# Altium footprint library WR-FPC_1.00mm.PcbLib: 105 footprints (part 5 of 7)
Each footprint in its own frame and in the unit in brackets; x right, y up, seen from the top. Pads: shape width x height; smd on the part's side, far side on the other; paste and mask are expansions set on the pad; w line width, h text height; cw(c..) or ccw(c..) is an arc to the next point about the centre after c.
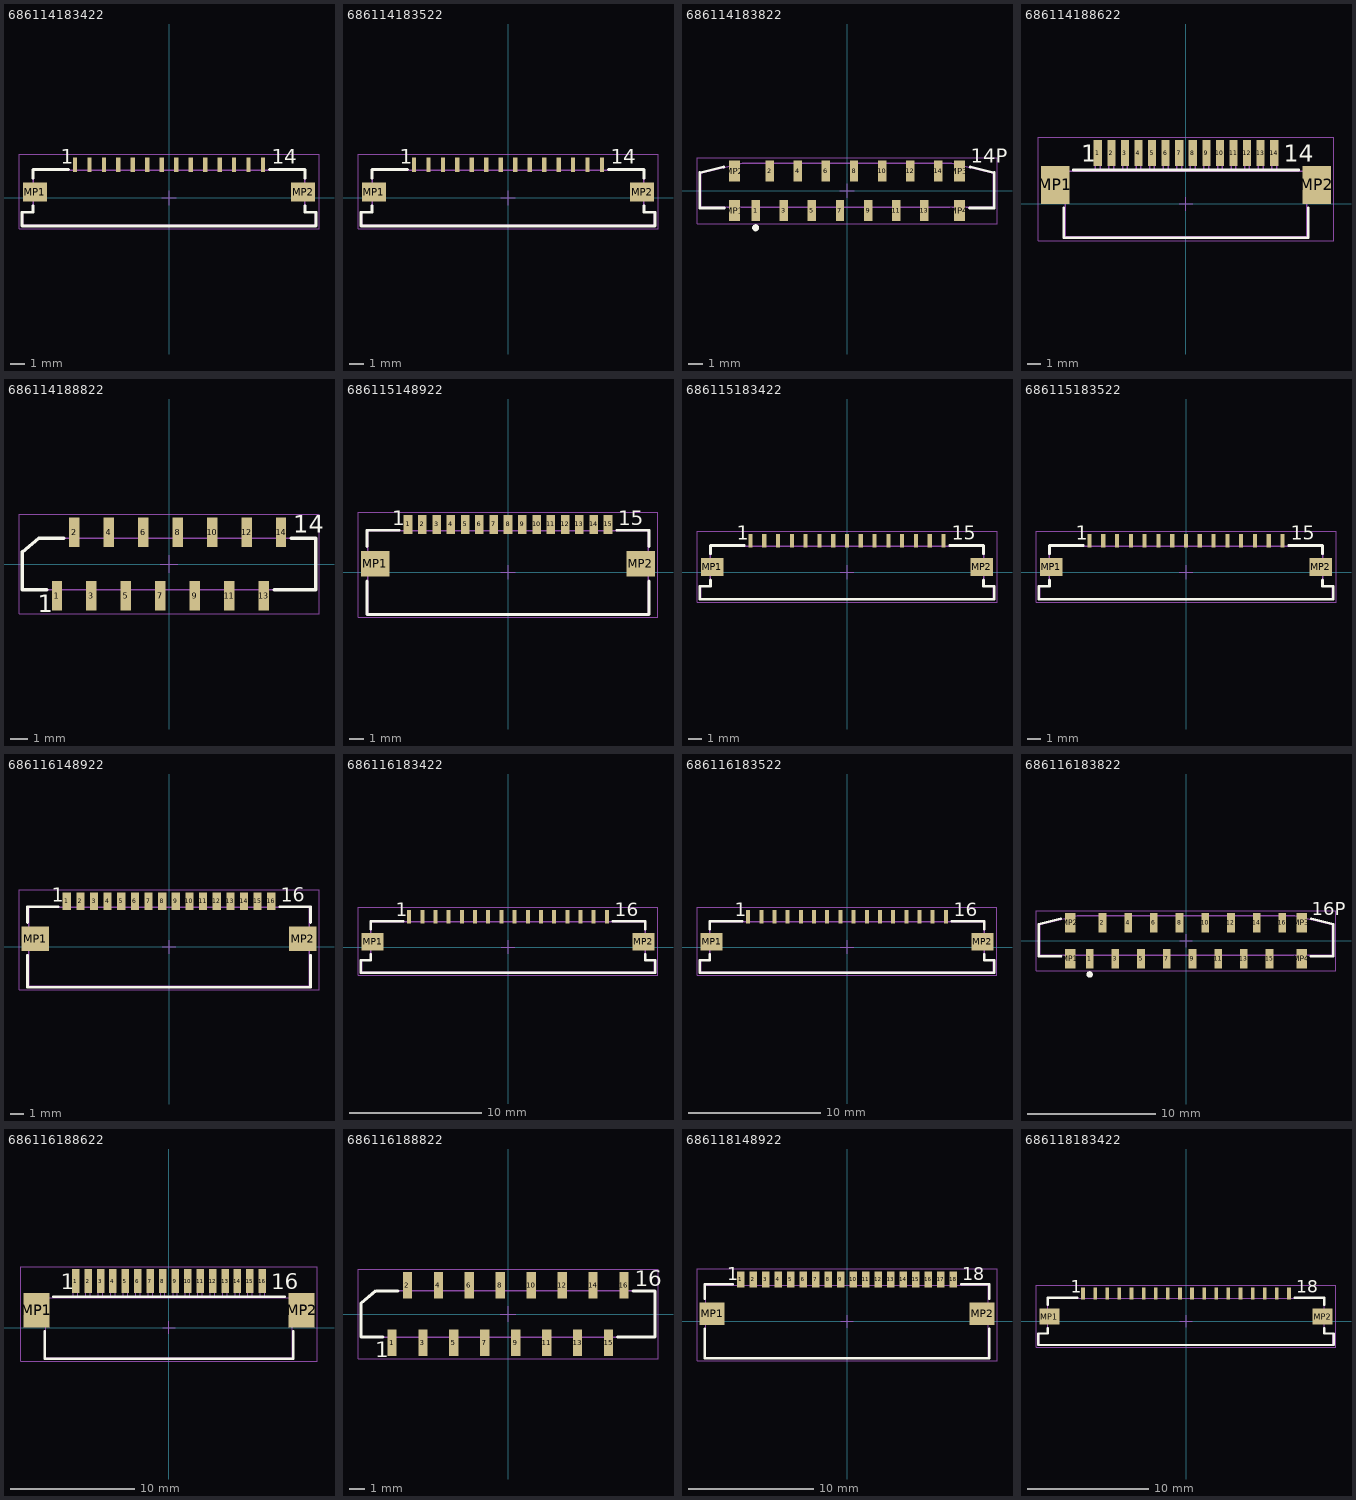
[diagram p4: the footprints below, top view; thin cyan lines are the x and y axes]

## 686114183422 [mm] "ZIF Connectors, Horizontal, Top Contact Low Profile, pitch 1mm, 14p"
height 1.3
pads (16):
  rect 0.3x1 smd: 1(-6.5,2.3) 2(-5.5,2.3) 3(-4.5,2.3) 4(-3.5,2.3) 5(-2.5,2.3) 6(-1.5,2.3) 7(-0.5,2.3) 8(0.5,2.3) 9(1.5,2.3) 10(2.5,2.3) 11(3.5,2.3) 12(4.5,2.3) 13(5.5,2.3) 14(6.5,2.3)
  rect 1.65x1.3 smd: MP1(-9.275,0.4) MP2(9.275,0.4)
Top Overlay:
  lines w0.2: -9.4,-0.55 -9.4,-1 -10.175,-1 -10.175,-1.95 10.175,-1.95 10.175,-1 9.4,-1 9.4,-0.55 ; -9.4,1.35 -9.4,1.95 -6.95,1.95 ; 6.95,1.95 9.4,1.95 9.4,1.35
  text "14" at 7.1,2.35 h1.02
  text "1" at -7.5,2.35 h1.02
Mechanical 13:
  lines w0.1: -10.1,-1 -9.4,-1 -9.4,1.9 9.4,1.9 9.4,-1 10.1,-1 10.1,-1.9 -10.1,-1.9 -10.1,-1 ; -10.1,-1 -10.1,-1
Mechanical 15:
  lines w0.05: -0.5,0 0.5,0 ; 0,-0.5 0,0.5 ; -10.375,-2.15 10.375,-2.15 10.375,3 -10.375,3 -10.375,-2.15
3D body "686114183422.stp": height 1.28, standoff -0.01, extent -10.1,-1.9 10.1,2.35

## 686114183522 [mm] "ZIF Connectors, Horizontal, Bottom Contact Low Profile, pitch 1mm, 14p"
height 1.3
pads (16):
  rect 0.3x1 smd: 1(-6.5,2.3) 2(-5.5,2.3) 3(-4.5,2.3) 4(-3.5,2.3) 5(-2.5,2.3) 6(-1.5,2.3) 7(-0.5,2.3) 8(0.5,2.3) 9(1.5,2.3) 10(2.5,2.3) 11(3.5,2.3) 12(4.5,2.3) 13(5.5,2.3) 14(6.5,2.3)
  rect 1.65x1.3 smd: MP1(-9.275,0.4) MP2(9.275,0.4)
Top Overlay:
  lines w0.2: -9.4,-0.55 -9.4,-1 -10.175,-1 -10.175,-1.95 10.175,-1.95 10.175,-1 9.4,-1 9.4,-0.55 ; -9.4,1.35 -9.4,1.95 -6.95,1.95 ; 6.95,1.95 9.4,1.95 9.4,1.35
  text "14" at 7.1,2.35 h1.02
  text "1" at -7.5,2.35 h1.02
Mechanical 13:
  lines w0.1: -10.1,-1 -10.1,-1.9 10.1,-1.9 10.1,-1 9.4,-1 9.4,1.9 -9.4,1.9 -9.4,-1 -10.1,-1 ; -10.1,-1 -10.1,-1
Mechanical 15:
  lines w0.05: -0.5,0 0.5,0 ; 0,-0.5 0,0.5 ; -10.375,-2.15 -10.375,3 10.375,3 10.375,-2.15 -10.375,-2.15
3D body "686114183522.stp": height 1.24, standoff -0.01, extent -10.1,-1.9 10.1,2.35

## 686114183822 [mm] "ZIF Connectors, Vertical, Type A, pitch 1mm, 14p"
height 4
pads (18):
  rect 0.6x1.5 smd: 1(-6.5,-1.4) 2(-5.5,1.4) 3(-4.5,-1.4) 4(-3.5,1.4) 5(-2.5,-1.4) 6(-1.5,1.4) 7(-0.5,-1.4) 8(0.5,1.4) 9(1.5,-1.4) 10(2.5,1.4) 11(3.5,-1.4) 12(4.5,1.4) 13(5.5,-1.4) 14(6.5,1.4)
  rect 0.8x1.5 smd: MP1(-8,-1.4) MP2(-8,1.4) MP3(8,1.4) MP4(8,-1.4)
Top Overlay:
  circle w0.25: c-6.5,-2.625 r0.125
  lines w0.2: -8.765,1.708 -10.475,1.297 -10.475,-1.225 -8.725,-1.225 ; 8.725,-1.225 10.475,-1.225 10.475,1.297 8.765,1.708
  text "14P" at 8.8,2 h1.02
Mechanical 13:
  lines w0.1: -10.4,-1.15 -10.4,1.24 -7.45,1.949 7.45,1.95 10.4,1.24 10.4,-1.15 -10.4,-1.15
Mechanical 15:
  lines w0.05: -0.5,0 0.5,0 ; 0,-0.5 0,0.5 ; -10.675,-2.35 -10.675,2.35 10.675,2.35 10.675,-2.35 -10.675,-2.35
3D body "686114183822.stp": height 4, standoff -0.02, extent -10.4,-1.65 10.4,1.95

## 686114188622 [mm] "LIF Connectors, Horizontal, Top Contact, pitch 1mm, 14p"
height 3.1
pads (16):
  rect 0.6x1.9 smd: 1(-6.5,3.75) 2(-5.5,3.75) 3(-4.5,3.75) 4(-3.5,3.75) 5(-2.5,3.75) 6(-1.5,3.75) 7(-0.5,3.75) 8(0.5,3.75) 9(1.5,3.75) 10(2.5,3.75) 11(3.5,3.75) 12(4.5,3.75) 13(5.5,3.75) 14(6.5,3.75)
  rect 2.1x2.8 smd: MP1(-9.65,1.4) MP2(9.65,1.4)
Top Overlay:
  lines w0.2: -9,-0.3 -9,-2.5 9,-2.5 9,-0.3 ; -8.3,2.5 8.3,2.5
  text "14" at 7.2,3.1 h1.27
  text "1" at -7.7,3.1 h1.27
Mechanical 13:
  lines w0.1: -6.675,2.4 -6.675,4.4 -6.325,4.4 -6.325,2.4 ; -5.675,2.4 -5.675,4.4 -5.325,4.4 -5.325,2.4 ; -4.675,2.4 -4.675,4.4 -4.325,4.4 -4.325,2.4 ; -3.675,2.4 -3.675,4.4 -3.325,4.4 -3.325,2.4 ; -2.675,2.4 -2.675,4.4 -2.325,4.4 -2.325,2.4 ; -1.675,2.4 -1.675,4.4 -1.325,4.4 -1.325,2.4 ; -0.675,2.4 -0.675,4.4 -0.325,4.4 -0.325,2.4 ; 0.325,2.4 0.325,4.4 0.675,4.4 0.675,2.4 ; 1.325,2.4 1.325,4.4 1.675,4.4 1.675,2.4 ; 2.325,2.4 2.325,4.4 2.675,4.4 2.675,2.4 ; 3.325,2.4 3.325,4.4 3.675,4.4 3.675,2.4 ; 4.325,2.4 4.325,4.4 4.675,4.4 4.675,2.4 ; 5.325,2.4 5.325,4.4 5.675,4.4 5.675,2.4 ; 6.325,2.4 6.325,4.4 6.675,4.4 6.675,2.4 ; -10.15,0.4 -10.15,2.4 10.15,2.4 10.15,0.4 8.9,0.4 8.9,-2.4 -8.9,-2.4 -8.9,0.4 -10.15,0.4
Mechanical 15:
  lines w0.05: -0.5,0 0.5,0 ; 0,-0.5 0,0.5 ; -10.9,-2.7 -10.9,4.9 10.9,4.9 10.9,-2.7 -10.9,-2.7
3D body "686114188622.stp": height 3.1, standoff -0.01, extent -10.15,-2.4 10.15,4.4

## 686114188822 [mm] "LIF Connectors, Vertical Type A,  pitch 1mm, 14p"
height 5.1
pads (14):
  rect 0.6x1.7 smd: 1(-6.5,-1.85) 2(-5.5,1.85) 3(-4.5,-1.85) 4(-3.5,1.85) 5(-2.5,-1.85) 6(-1.5,1.85) 7(-0.5,-1.85) 8(0.5,1.85) 9(1.5,-1.85) 10(2.5,1.85) 11(3.5,-1.85) 12(4.5,1.85) 13(5.5,-1.85) 14(6.5,1.85)
Top Overlay:
  lines w0.2: -7.1,-1.5 -8.5,-1.5 -8.5,0.7 -7.547,1.5 -6.1,1.5 ; 6.1,-1.5 8.5,-1.5 8.5,1.5 7.1,1.5
  text "1" at -7.6,-2.8 h1.02
  text "14" at 7.2,1.8 h1.02
Mechanical 13:
  lines w0.1: -7.547,1.5 8.5,1.5 8.5,-1.5 -8.5,-1.5 -8.5,0.7 -7.547,1.5 ; -6.675,-1.5 -6.675,-2.2 -6.325,-2.2 -6.325,-1.5 ; -5.675,1.5 -5.675,2.2 -5.325,2.2 -5.325,1.5 ; -4.675,-1.5 -4.675,-2.2 -4.325,-2.2 -4.325,-1.5 ; -3.675,1.5 -3.675,2.2 -3.325,2.2 -3.325,1.5 ; -2.675,-1.5 -2.675,-2.2 -2.325,-2.2 -2.325,-1.5 ; -1.675,1.5 -1.675,2.2 -1.325,2.2 -1.325,1.5 ; -0.675,-1.5 -0.675,-2.2 -0.325,-2.2 -0.325,-1.5 ; 0.325,1.5 0.325,2.2 0.675,2.2 0.675,1.5 ; 1.325,-1.5 1.325,-2.2 1.675,-2.2 1.675,-1.5 ; 2.325,1.5 2.325,2.2 2.675,2.2 2.675,1.5 ; 3.325,-1.5 3.325,-2.2 3.675,-2.2 3.675,-1.5 ; 4.325,1.5 4.325,2.2 4.675,2.2 4.675,1.5 ; 5.325,-1.5 5.325,-2.2 5.675,-2.2 5.675,-1.5 ; 6.325,1.5 6.325,2.2 6.675,2.2 6.675,1.5
Mechanical 15:
  lines w0.05: -0.5,0 0.5,0 ; 0,-0.5 0,0.5 ; -8.7,-2.9 -8.7,2.9 8.7,2.9 8.7,-2.9 -8.7,-2.9
3D body "686114188822.stp": height 5.21, standoff 0.01, extent -8.5,-2.2 8.5,2.2

## 686115148922 [mm] "ZIF Connectors, Horizontal, Bottom Contact Hinge Type, pitch 1mm, 15p"
height 2.3
pads (17):
  rect 0.6x1.3 smd: 1(-7,3.35) 2(-6,3.35) 3(-5,3.35) 4(-4,3.35) 5(-3,3.35) 6(-2,3.35) 7(-1,3.35) 8(0,3.35) 9(1,3.35) 10(2,3.35) 11(3,3.35) 12(4,3.35) 13(5,3.35) 14(6,3.35) 15(7,3.35)
  rect 2x1.8 smd: MP1(-9.3,0.6) MP2(9.3,0.6)
Top Overlay:
  lines w0.2: -9.875,-0.6 -9.875,-2.95 9.875,-2.95 9.875,-0.6 ; -9.875,1.8 -9.875,2.95 -7.625,2.95 ; 7.625,2.95 9.875,2.95 9.875,1.8
  text "15" at 7.7,3.3 h1.02
  text "1" at -8.1,3.3 h1.02
Mechanical 13:
  lines w0.1: -9.8,-2.9 -9.8,2.9 9.8,2.9 9.8,-2.9 -9.8,-2.9
Mechanical 15:
  lines w0.05: -0.5,0 0.5,0 ; 0,-0.5 0,0.5 ; -10.5,-3.15 -10.5,4.2 10.5,4.2 10.5,-3.15 -10.5,-3.15
3D body "686115148922.stp": height 2.27, standoff 0.02, extent -9.8,-2.9 9.8,3.6

## 686115183422 [mm] "ZIF Connectors, Horizontal, Top Contact Low Profile, pitch 1mm, 15p"
height 1.3
pads (17):
  rect 0.3x1 smd: 1(-7,2.3) 2(-6,2.3) 3(-5,2.3) 4(-4,2.3) 5(-3,2.3) 6(-2,2.3) 7(-1,2.3) 8(0,2.3) 9(1,2.3) 10(2,2.3) 11(3,2.3) 12(4,2.3) 13(5,2.3) 14(6,2.3) 15(7,2.3)
  rect 1.65x1.3 smd: MP1(-9.775,0.4) MP2(9.775,0.4)
Top Overlay:
  lines w0.2: -9.9,-0.55 -9.9,-1 -10.675,-1 -10.675,-1.95 10.675,-1.95 10.675,-1 9.9,-1 9.9,-0.55 ; -9.9,1.35 -9.9,1.95 -7.45,1.95 ; 7.45,1.95 9.9,1.95 9.9,1.35
  text "15" at 7.6,2.35 h1.02
  text "1" at -8,2.35 h1.02
Mechanical 13:
  lines w0.1: -10.6,-1 -10.6,-1.9 10.6,-1.9 10.6,-1 9.9,-1 9.9,1.9 -9.9,1.9 -9.9,-1 -10.6,-1 ; -10.6,-1 -10.6,-1
Mechanical 15:
  lines w0.05: -0.5,0 0.5,0 ; 0,-0.5 0,0.5 ; -10.875,-2.15 -10.875,3 10.875,3 10.875,-2.15 -10.875,-2.15
3D body "686115183422.stp": height 1.28, standoff -0.01, extent -10.6,-1.9 10.6,2.35

## 686115183522 [mm] "ZIF Connectors, Horizontal, Bottom Contact Low Profile, pitch 1mm, 15p"
height 1.3
pads (17):
  rect 0.3x1 smd: 1(-7,2.3) 2(-6,2.3) 3(-5,2.3) 4(-4,2.3) 5(-3,2.3) 6(-2,2.3) 7(-1,2.3) 8(0,2.3) 9(1,2.3) 10(2,2.3) 11(3,2.3) 12(4,2.3) 13(5,2.3) 14(6,2.3) 15(7,2.3)
  rect 1.65x1.3 smd: MP1(-9.775,0.4) MP2(9.775,0.4)
Top Overlay:
  lines w0.2: -9.9,-0.55 -9.9,-1 -10.675,-1 -10.675,-1.95 10.675,-1.95 10.675,-1 9.9,-1 9.9,-0.55 ; -9.9,1.35 -9.9,1.95 -7.45,1.95 ; 7.45,1.95 9.9,1.95 9.9,1.35
  text "15" at 7.6,2.35 h1.02
  text "1" at -8,2.35 h1.02
Mechanical 13:
  lines w0.1: -10.6,-1 -9.9,-1 -9.9,1.9 9.9,1.9 9.9,-1 10.6,-1 10.6,-1.9 -10.6,-1.9 -10.6,-1 ; -10.6,-1 -10.6,-1
Mechanical 15:
  lines w0.05: -0.5,0 0.5,0 ; 0,-0.5 0,0.5 ; -10.875,-2.15 10.875,-2.15 10.875,3 -10.875,3 -10.875,-2.15
3D body "686115183522.stp": height 1.24, standoff -0.01, extent -10.6,-1.9 10.6,2.35

## 686116148922 [mm] "ZIF Connectors, Horizontal, Bottom Contact Hinge Type, pitch 1mm, 16p"
height 2.3
pads (18):
  rect 0.6x1.3 smd: 1(-7.5,3.35) 2(-6.5,3.35) 3(-5.5,3.35) 4(-4.5,3.35) 5(-3.5,3.35) 6(-2.5,3.35) 7(-1.5,3.35) 8(-0.5,3.35) 9(0.5,3.35) 10(1.5,3.35) 11(2.5,3.35) 12(3.5,3.35) 13(4.5,3.35) 14(5.5,3.35) 15(6.5,3.35) 16(7.5,3.35)
  rect 2x1.8 smd: MP1(-9.8,0.6) MP2(9.8,0.6)
Top Overlay:
  lines w0.2: -10.375,-0.6 -10.375,-2.95 10.375,-2.95 10.375,-0.6 ; -10.375,1.8 -10.375,2.95 -8.125,2.95 ; 8.125,2.95 10.375,2.95 10.375,1.8
  text "16" at 8.2,3.3 h1.02
  text "1" at -8.6,3.3 h1.02
Mechanical 13:
  lines w0.1: -10.3,-2.9 10.3,-2.9 10.3,2.9 -10.3,2.9 -10.3,-2.9
Mechanical 15:
  lines w0.05: -0.5,0 0.5,0 ; 0,-0.5 0,0.5 ; -11,-3.15 11,-3.15 11,4.2 -11,4.2 -11,-3.15
3D body "686116148922.stp": height 2.27, standoff 0.02, extent -10.3,-2.9 10.3,3.6

## 686116183422 [mm] "ZIF Connectors, Horizontal, Top Contact Low Profile, pitch 1mm, 16p"
height 1.3
pads (18):
  rect 0.3x1 smd: 1(-7.5,2.3) 2(-6.5,2.3) 3(-5.5,2.3) 4(-4.5,2.3) 5(-3.5,2.3) 6(-2.5,2.3) 7(-1.5,2.3) 8(-0.5,2.3) 9(0.5,2.3) 10(1.5,2.3) 11(2.5,2.3) 12(3.5,2.3) 13(4.5,2.3) 14(5.5,2.3) 15(6.5,2.3) 16(7.5,2.3)
  rect 1.65x1.3 smd: MP1(-10.275,0.4) MP2(10.275,0.4)
Top Overlay:
  lines w0.2: -10.4,-0.55 -10.4,-1 -11.175,-1 -11.175,-1.95 11.175,-1.95 11.175,-1 10.4,-1 10.4,-0.55 ; -10.4,1.35 -10.4,1.95 -7.95,1.95 ; 7.95,1.95 10.4,1.95 10.4,1.35
  text "16" at 8.1,2.35 h1.02
  text "1" at -8.5,2.35 h1.02
Mechanical 13:
  lines w0.1: -11.1,-1 -10.4,-1 -10.4,1.9 10.4,1.9 10.4,-1 11.1,-1 11.1,-1.9 -11.1,-1.9 -11.1,-1 ; -11.1,-1 -11.1,-1
Mechanical 15:
  lines w0.05: -0.5,0 0.5,0 ; 0,-0.5 0,0.5 ; -11.375,-2.15 11.375,-2.15 11.375,3 -11.375,3 -11.375,-2.15
3D body "686116183422.stp": height 1.28, standoff -0.01, extent -11.1,-1.9 11.1,2.35

## 686116183522 [mm] "ZIF Connectors, Horizontal, Bottom Contact Low Profile, pitch 1mm, 16p"
height 1.3
pads (18):
  rect 0.3x1 smd: 1(-7.5,2.3) 2(-6.5,2.3) 3(-5.5,2.3) 4(-4.5,2.3) 5(-3.5,2.3) 6(-2.5,2.3) 7(-1.5,2.3) 8(-0.5,2.3) 9(0.5,2.3) 10(1.5,2.3) 11(2.5,2.3) 12(3.5,2.3) 13(4.5,2.3) 14(5.5,2.3) 15(6.5,2.3) 16(7.5,2.3)
  rect 1.65x1.3 smd: MP1(-10.275,0.4) MP2(10.275,0.4)
Top Overlay:
  lines w0.2: -10.4,-0.55 -10.4,-1 -11.175,-1 -11.175,-1.95 11.175,-1.95 11.175,-1 10.4,-1 10.4,-0.55 ; -10.4,1.35 -10.4,1.95 -7.95,1.95 ; 7.95,1.95 10.4,1.95 10.4,1.35
  text "16" at 8.1,2.35 h1.02
  text "1" at -8.5,2.35 h1.02
Mechanical 13:
  lines w0.1: -11.1,-1 -11.1,-1.9 11.1,-1.9 11.1,-1 10.4,-1 10.4,1.9 -10.4,1.9 -10.4,-1 -11.1,-1 ; -11.1,-1 -11.1,-1
Mechanical 15:
  lines w0.05: -0.5,0 0.5,0 ; 0,-0.5 0,0.5 ; -11.375,-2.15 -11.375,3 11.375,3 11.375,-2.15 -11.375,-2.15
3D body "686116183522.stp": height 1.24, standoff -0.01, extent -11.1,-1.9 11.1,2.35

## 686116183822 [mm] "ZIF Connectors, Vertical, Type A, pitch 1mm, 16p"
height 4
pads (20):
  rect 0.6x1.5 smd: 1(-7.5,-1.4) 2(-6.5,1.4) 3(-5.5,-1.4) 4(-4.5,1.4) 5(-3.5,-1.4) 6(-2.5,1.4) 7(-1.5,-1.4) 8(-0.5,1.4) 9(0.5,-1.4) 10(1.5,1.4) 11(2.5,-1.4) 12(3.5,1.4) 13(4.5,-1.4) 14(5.5,1.4) 15(6.5,-1.4) 16(7.5,1.4)
  rect 0.8x1.5 smd: MP1(-9,-1.4) MP2(-9,1.4) MP3(9,1.4) MP4(9,-1.4)
Top Overlay:
  circle w0.25: c-7.5,-2.625 r0.125
  lines w0.2: -9.765,1.708 -11.475,1.297 -11.475,-1.225 -9.725,-1.225 ; 9.725,-1.225 11.475,-1.225 11.475,1.297 9.765,1.708
  text "16P" at 9.8,2 h1.02
Mechanical 13:
  lines w0.1: -8.45,1.95 8.45,1.95 11.4,1.24 11.4,-1.15 -11.4,-1.15 -11.4,1.24 -8.45,1.949
Mechanical 15:
  lines w0.05: -0.5,0 0.5,0 ; 0,-0.5 0,0.5 ; -11.675,-2.35 11.675,-2.35 11.675,2.35 -11.675,2.35 -11.675,-2.35
3D body "686116183822.stp": height 4, standoff -0.02, extent -11.4,-1.65 11.4,1.95

## 686116188622 [mm] "LIF Connectors, Horizontal, Top Contact, pitch 1mm, 16p"
height 3.1
pads (18):
  rect 0.6x1.9 smd: 1(-7.5,3.75) 2(-6.5,3.75) 3(-5.5,3.75) 4(-4.5,3.75) 5(-3.5,3.75) 6(-2.5,3.75) 7(-1.5,3.75) 8(-0.5,3.75) 9(0.5,3.75) 10(1.5,3.75) 11(2.5,3.75) 12(3.5,3.75) 13(4.5,3.75) 14(5.5,3.75) 15(6.5,3.75) 16(7.5,3.75)
  rect 2.1x2.8 smd: MP1(-10.65,1.4) MP2(10.65,1.4)
Top Overlay:
  lines w0.2: -10,-0.3 -10,-2.5 10,-2.5 10,-0.3 ; -9.3,2.5 9.3,2.5
  text "1" at -8.7,3.1 h1.27
  text "16" at 8.2,3.1 h1.27
Mechanical 13:
  lines w0.1: -7.675,2.4 -7.675,4.4 -7.325,4.4 -7.325,2.4 ; -6.675,2.4 -6.675,4.4 -6.325,4.4 -6.325,2.4 ; -5.675,2.4 -5.675,4.4 -5.325,4.4 -5.325,2.4 ; -4.675,2.4 -4.675,4.4 -4.325,4.4 -4.325,2.4 ; -3.675,2.4 -3.675,4.4 -3.325,4.4 -3.325,2.4 ; -2.675,2.4 -2.675,4.4 -2.325,4.4 -2.325,2.4 ; -1.675,2.4 -1.675,4.4 -1.325,4.4 -1.325,2.4 ; -0.675,2.4 -0.675,4.4 -0.325,4.4 -0.325,2.4 ; 0.325,2.4 0.325,4.4 0.675,4.4 0.675,2.4 ; 1.325,2.4 1.325,4.4 1.675,4.4 1.675,2.4 ; 2.325,2.4 2.325,4.4 2.675,4.4 2.675,2.4 ; 3.325,2.4 3.325,4.4 3.675,4.4 3.675,2.4 ; 4.325,2.4 4.325,4.4 4.675,4.4 4.675,2.4 ; 5.325,2.4 5.325,4.4 5.675,4.4 5.675,2.4 ; 6.325,2.4 6.325,4.4 6.675,4.4 6.675,2.4 ; 7.325,2.4 7.325,4.4 7.675,4.4 7.675,2.4 ; -11.15,0.4 -11.15,2.4 11.15,2.4 11.15,0.4 9.9,0.4 9.9,-2.4 -9.9,-2.4 -9.9,0.4 -11.15,0.4
Mechanical 15:
  lines w0.05: -0.5,0 0.5,0 ; 0,-0.5 0,0.5 ; -11.9,-2.7 -11.9,4.9 11.9,4.9 11.9,-2.7 -11.9,-2.7
3D body "686116188622.stp": height 3.1, standoff -0.01, extent -11.15,-2.4 11.15,4.4

## 686116188822 [mm] "LIF Connectors, Vertical Type A,  pitch 1mm, 16p"
height 5.1
pads (16):
  rect 0.6x1.7 smd: 1(-7.5,-1.85) 2(-6.5,1.85) 3(-5.5,-1.85) 4(-4.5,1.85) 5(-3.5,-1.85) 6(-2.5,1.85) 7(-1.5,-1.85) 8(-0.5,1.85) 9(0.5,-1.85) 10(1.5,1.85) 11(2.5,-1.85) 12(3.5,1.85) 13(4.5,-1.85) 14(5.5,1.85) 15(6.5,-1.85) 16(7.5,1.85)
Top Overlay:
  lines w0.2: -8.1,-1.5 -9.5,-1.5 -9.5,0.7 -8.547,1.5 -7.1,1.5 ; 7.1,-1.5 9.5,-1.5 9.5,1.5 8.1,1.5
  text "1" at -8.6,-2.8 h1.02
  text "16" at 8.2,1.8 h1.02
Mechanical 13:
  lines w0.1: -7.675,-1.5 -7.675,-2.2 -7.325,-2.2 -7.325,-1.5 ; -6.675,1.5 -6.675,2.2 -6.325,2.2 -6.325,1.5 ; -5.675,-1.5 -5.675,-2.2 -5.325,-2.2 -5.325,-1.5 ; -4.675,1.5 -4.675,2.2 -4.325,2.2 -4.325,1.5 ; -3.675,-1.5 -3.675,-2.2 -3.325,-2.2 -3.325,-1.5 ; -2.675,1.5 -2.675,2.2 -2.325,2.2 -2.325,1.5 ; -1.675,-1.5 -1.675,-2.2 -1.325,-2.2 -1.325,-1.5 ; -0.675,1.5 -0.675,2.2 -0.325,2.2 -0.325,1.5 ; 0.325,-1.5 0.325,-2.2 0.675,-2.2 0.675,-1.5 ; 1.325,1.5 1.325,2.2 1.675,2.2 1.675,1.5 ; 2.325,-1.5 2.325,-2.2 2.675,-2.2 2.675,-1.5 ; 3.325,1.5 3.325,2.2 3.675,2.2 3.675,1.5 ; 4.325,-1.5 4.325,-2.2 4.675,-2.2 4.675,-1.5 ; 5.325,1.5 5.325,2.2 5.675,2.2 5.675,1.5 ; 6.325,-1.5 6.325,-2.2 6.675,-2.2 6.675,-1.5 ; 7.325,1.5 7.325,2.2 7.675,2.2 7.675,1.5 ; -9.5,-1.5 -9.5,0.7 -8.547,1.5 9.5,1.5 9.5,-1.5 -9.5,-1.5
Mechanical 15:
  lines w0.05: -0.5,0 0.5,0 ; 0,-0.5 0,0.5 ; -9.7,-2.9 -9.7,2.9 9.7,2.9 9.7,-2.9 -9.7,-2.9
3D body "686116188822.stp": height 5.21, standoff 0.01, extent -9.5,-2.2 9.5,2.2

## 686118148922 [mm] "ZIF Connectors, Horizontal, Bottom Contact Hinge Type, pitch 1mm, 18p"
height 2.3
pads (20):
  rect 0.6x1.3 smd: 1(-8.5,3.35) 2(-7.5,3.35) 3(-6.5,3.35) 4(-5.5,3.35) 5(-4.5,3.35) 6(-3.5,3.35) 7(-2.5,3.35) 8(-1.5,3.35) 9(-0.5,3.35) 10(0.5,3.35) 11(1.5,3.35) 12(2.5,3.35) 13(3.5,3.35) 14(4.5,3.35) 15(5.5,3.35) 16(6.5,3.35) 17(7.5,3.35) 18(8.5,3.35)
  rect 2x1.8 smd: MP1(-10.8,0.6) MP2(10.8,0.6)
Top Overlay:
  lines w0.2: -11.375,-0.6 -11.375,-2.95 11.375,-2.95 11.375,-0.6 ; -11.375,1.8 -11.375,2.95 -9.125,2.95 ; 9.125,2.95 11.375,2.95 11.375,1.8
  text "18" at 9.2,3.3 h1.02
  text "1" at -9.6,3.3 h1.02
Mechanical 13:
  lines w0.1: -11.3,-2.9 11.3,-2.9 11.3,2.9 -11.3,2.9 -11.3,-2.9
Mechanical 15:
  lines w0.05: -0.5,0 0.5,0 ; 0,-0.5 0,0.5 ; -12,-3.15 12,-3.15 12,4.2 -12,4.2 -12,-3.15
3D body "686118148922.stp": height 2.27, standoff 0.02, extent -11.3,-2.9 11.3,3.6

## 686118183422 [mm] "ZIF Connectors, Horizontal, Top Contact Low Profile, pitch 1mm, 18p"
height 1.3
pads (20):
  rect 0.3x1 smd: 1(-8.5,2.3) 2(-7.5,2.3) 3(-6.5,2.3) 4(-5.5,2.3) 5(-4.5,2.3) 6(-3.5,2.3) 7(-2.5,2.3) 8(-1.5,2.3) 9(-0.5,2.3) 10(0.5,2.3) 11(1.5,2.3) 12(2.5,2.3) 13(3.5,2.3) 14(4.5,2.3) 15(5.5,2.3) 16(6.5,2.3) 17(7.5,2.3) 18(8.5,2.3)
  rect 1.65x1.3 smd: MP1(-11.275,0.4) MP2(11.275,0.4)
Top Overlay:
  lines w0.2: -11.4,-0.55 -11.4,-1 -12.175,-1 -12.175,-1.95 12.175,-1.95 12.175,-1 11.4,-1 11.4,-0.55 ; -11.4,1.35 -11.4,1.95 -8.95,1.95 ; 8.95,1.95 11.4,1.95 11.4,1.35
  text "18" at 9.1,2.35 h1.02
  text "1" at -9.5,2.35 h1.02
Mechanical 13:
  lines w0.1: -12.1,-1 -12.1,-1.9 12.1,-1.9 12.1,-1 11.4,-1 11.4,1.9 -11.4,1.9 -11.4,-1 -12.1,-1 ; -12.1,-1 -12.1,-1
Mechanical 15:
  lines w0.05: -0.5,0 0.5,0 ; 0,-0.5 0,0.5 ; -12.375,-2.15 -12.375,3 12.375,3 12.375,-2.15 -12.375,-2.15
3D body "686118183422.stp": height 1.28, standoff -0.01, extent -12.1,-1.9 12.1,2.35